# Altium schematic symbol library TTL74系列.SchLib: 649 symbols (part 2 of 6)
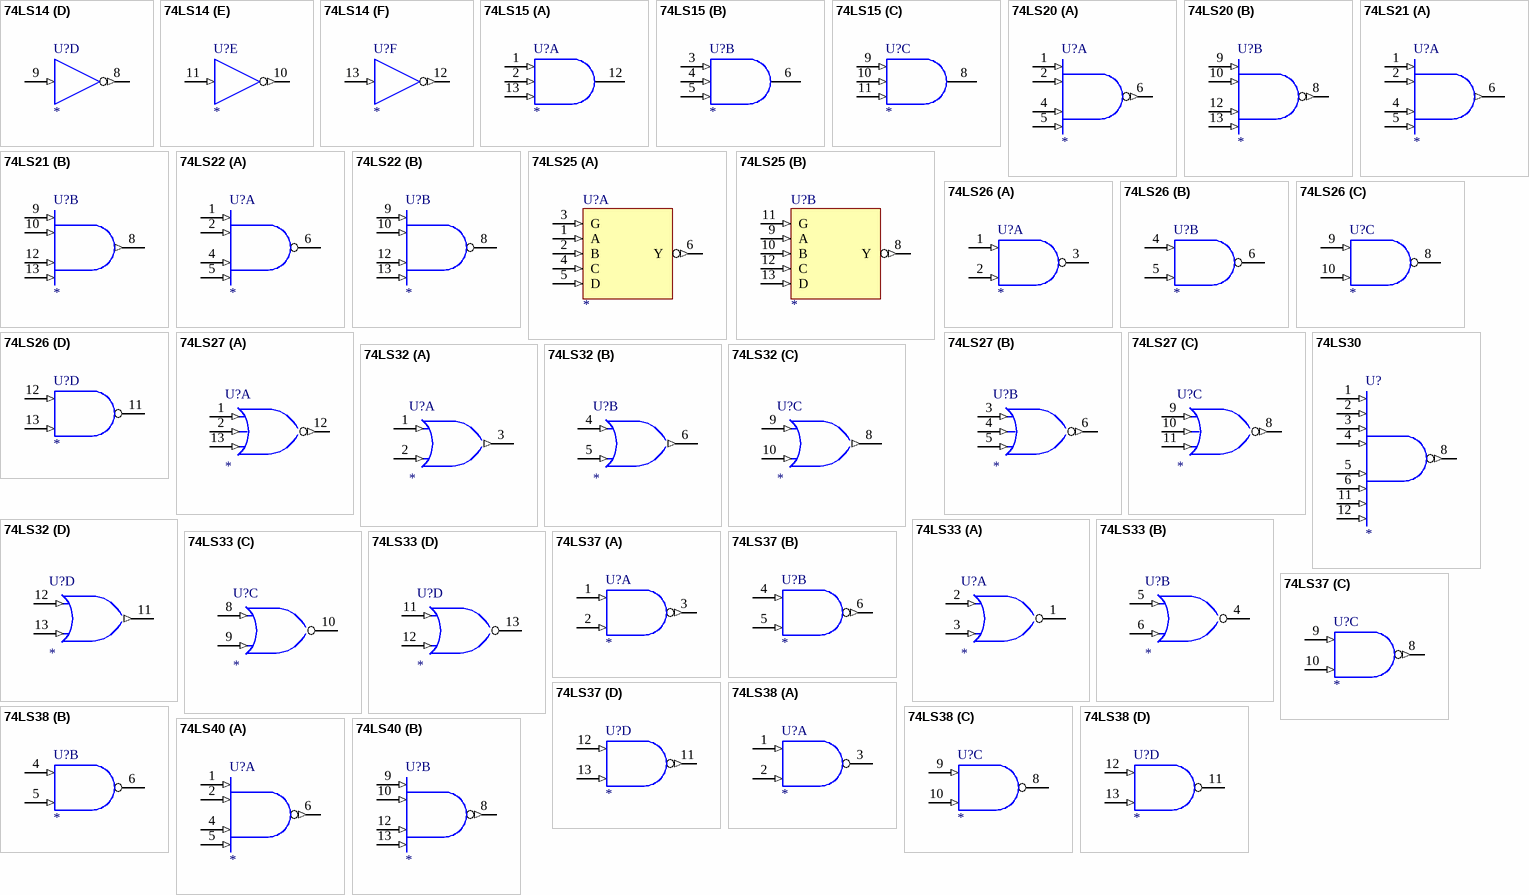
[diagram p31: symbols 74LS14 to 74LS40]

## 74LS26
designator U?
High-Voltage Interface Positive-NAND Gate
footprint DIP-14
simulation model 74LS26 (SIMCODE)
part A pins: 1 A (in), 2 B (in), 3 Y (oc), 7 GND (power) hidden to GND, 14 VCC (power) hidden to VCC
part B pins: 4 A (in), 5 B (in), 6 Y (oc), 7 GND (power) hidden to GND, 14 VCC (power) hidden to VCC
part C pins: 7 GND (power) hidden to GND, 8 Y (oc), 9 A (in), 10 B (in), 14 VCC (power) hidden to VCC
part D pins: 7 GND (power) hidden to GND, 11 Y (oc), 12 A (in), 13 B (in), 14 VCC (power) hidden to VCC
1 alternate drawing of the same symbol

## 74LS27
designator U?
Triple 3-Input Positive-NOR Gate
footprint DIP-14
simulation model 74LS27 (SIMCODE)
part A pins: 1 A (in), 2 B (in), 7 GND (power) hidden to GND, 12 Y (out), 13 C (in), 14 VCC (power) hidden to VCC
part B pins: 3 A (in), 4 B (in), 5 C (in), 6 Y (out), 7 GND (power) hidden to GND, 14 VCC (power) hidden to VCC
part C pins: 7 GND (power) hidden to GND, 8 Y (out), 9 A (in), 10 B (in), 11 C (in), 14 VCC (power) hidden to VCC
1 alternate drawing of the same symbol

## 74LS30
designator U?
8-Input Positive-NAND Gate
footprint DIP-14
simulation model 74LS30 (SIMCODE)
pins: 1 A (in), 2 B (in), 3 C (in), 4 D (in), 5 E (in), 6 F (in), 7 GND (power) hidden to GND, 8 Y (out), 11 G (in), 12 H (in), 14 VCC (power) hidden to VCC
1 alternate drawing of the same symbol

## 74LS32
designator U?
Quad 2-Input Positive-OR Gate
footprint DIP-14
simulation model 74LS32 (SIMCODE)
part A pins: 1 A (in), 2 B (in), 3 Y (out), 7 GND (power) hidden to GND, 14 VCC (power) hidden to VCC
part B pins: 4 A (in), 5 B (in), 6 Y (out), 7 GND (power) hidden to GND, 14 VCC (power) hidden to VCC
part C pins: 7 GND (power) hidden to GND, 8 Y (out), 9 A (in), 10 B (in), 14 VCC (power) hidden to VCC
part D pins: 7 GND (power) hidden to GND, 11 Y (out), 12 A (in), 13 B (in), 14 VCC (power) hidden to VCC
1 alternate drawing of the same symbol

## 74LS33
designator U?
Quad 2-Input Positive-NOR Buffer with Open-Collector Output
footprint DIP-14
simulation model 74LS33 (SIMCODE)
part A pins: 1 Y (oc), 2 A (in), 3 B (in), 7 GND (power) hidden to GND, 14 VCC (power) hidden to VCC
part B pins: 4 Y (oc), 5 A (in), 6 B (in), 7 GND (power) hidden to GND, 14 VCC (power) hidden to VCC
part C pins: 7 GND (power) hidden to GND, 8 A (in), 9 B (in), 10 Y (oc), 14 VCC (power) hidden to VCC
part D pins: 7 GND (power) hidden to GND, 11 A (in), 12 B (in), 13 Y (oc), 14 VCC (power) hidden to VCC
1 alternate drawing of the same symbol

## 74LS37
designator U?
Quad 2-Input Positive-NAND Buffer
footprint DIP-14
simulation model 74LS37 (SIMCODE)
part A pins: 1 A (in), 2 B (in), 3 Y (out), 7 GND (power) hidden to GND, 14 VCC (power) hidden to VCC
part B pins: 4 A (in), 5 B (in), 6 Y (out), 7 GND (power) hidden to GND, 14 VCC (power) hidden to VCC
part C pins: 7 GND (power) hidden to GND, 8 Y (out), 9 A (in), 10 B (in), 14 VCC (power) hidden to VCC
part D pins: 7 GND (power) hidden to GND, 11 Y (out), 12 A (in), 13 B (in), 14 VCC (power) hidden to VCC
1 alternate drawing of the same symbol

## 74LS38
designator U?
Quad 2-Input Positive-NAND Buffer with Open-Collector Output
footprint DIP-14
simulation model 74LS38 (SIMCODE)
part A pins: 1 A (in), 2 B (in), 3 Y (oc), 7 GND (power) hidden to GND, 14 VCC (power) hidden to VCC
part B pins: 4 A (in), 5 B (in), 6 Y (oc), 7 GND (power) hidden to GND, 14 VCC (power) hidden to VCC
part C pins: 7 GND (power) hidden to GND, 8 Y (oc), 9 A (in), 10 B (in), 14 VCC (power) hidden to VCC
part D pins: 7 GND (power) hidden to GND, 11 Y (oc), 12 A (in), 13 B (in), 14 VCC (power) hidden to VCC
1 alternate drawing of the same symbol

## 74LS40
designator U?
Dual 4-Input Positive-NAND Buffer
footprint DIP-14
simulation model 74LS40 (SIMCODE)
part A pins: 1 A (in), 2 B (in), 4 C (in), 5 D (in), 6 Y (out), 7 GND (power) hidden to GND, 14 VCC (power) hidden to VCC
part B pins: 7 GND (power) hidden to GND, 8 Y (out), 9 A (in), 10 B (in), 12 C (in), 13 D (in), 14 VCC (power) hidden to VCC
2 alternate drawings of the same symbol

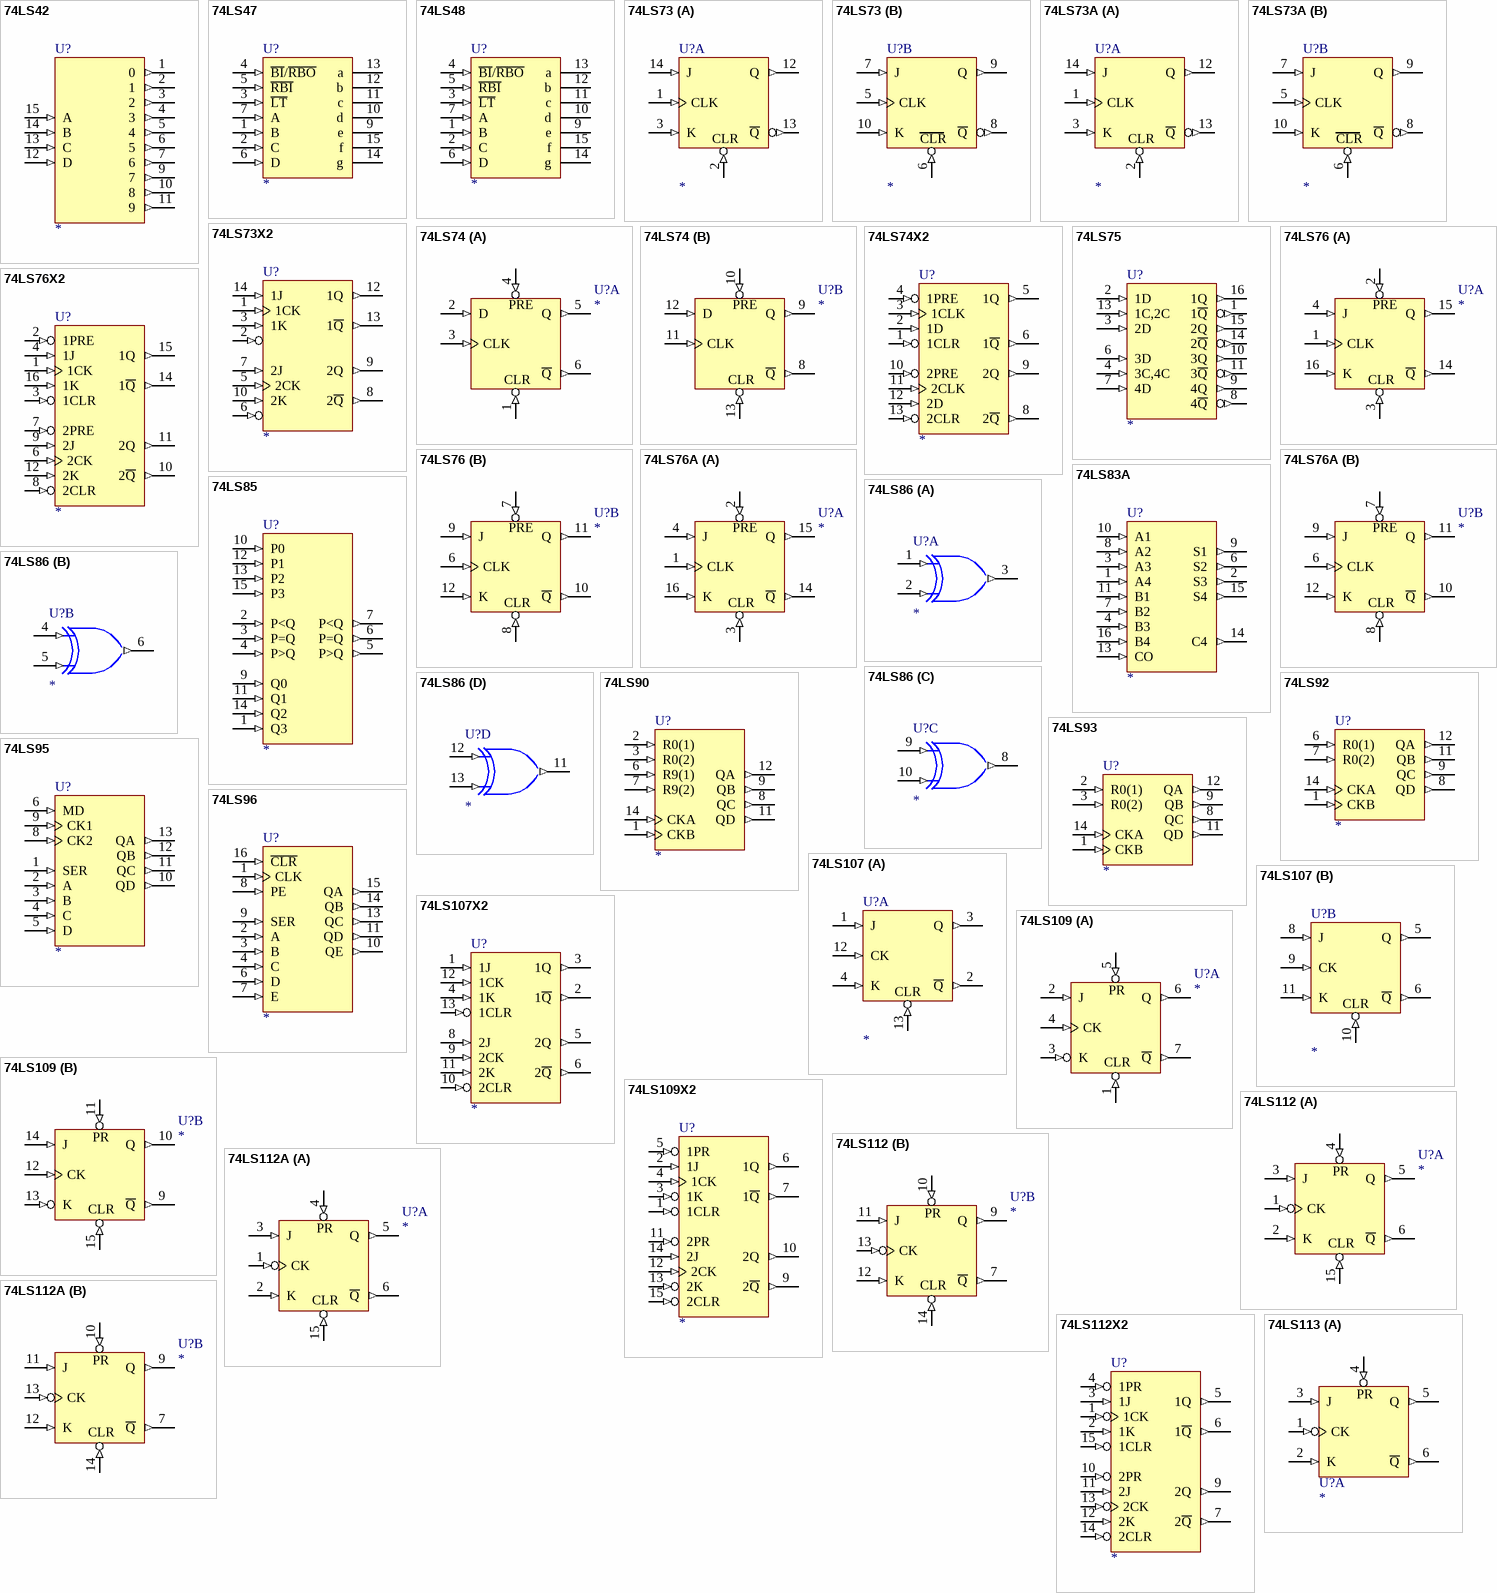
[diagram p6: symbols 74LS42 to 74LS113]

## 74LS42
designator U?
4-Line BCD to 10-Line Decimal Decoder
footprint DIP-16
simulation model 74LS42 (SIMCODE)
pins: 1 0 (out), 2 1 (out), 3 2 (out), 4 3 (out), 5 4 (out), 6 5 (out), 7 6 (out), 8 GND (power) hidden to GND, 9 7 (out), 10 8 (out), 11 9 (out), 12 D (in), 13 C (in), 14 B (in), 15 A (in), 16 VCC (power) hidden to VCC
1 alternate drawing of the same symbol

## 74LS47
designator U?
BCD-to-Seven-Segment Decoder/Driver
footprint DIP-16
simulation model 74LS47 (SIMCODE)
pins: 1 B (in), 2 C (in), 3 ~{LT} (in), 4 ~{BI}/~{RBO} (in), 5 ~{RBI} (in), 6 D (in), 7 A (in), 8 GND (power) hidden to GND, 9 e (oc), 10 d (oc), 11 c (oc), 12 b (oc), 13 a (oc), 14 g (oc), 15 f (oc), 16 VCC (power) hidden to VCC
1 alternate drawing of the same symbol

## 74LS48
designator U?
BCD-to-Seven-Segment Decoder/Driver
footprint DIP-16
simulation model 74LS48 (SIMCODE)
pins: 1 B (in), 2 C (in), 3 ~{LT} (in), 4 ~{BI}/~{RBO} (in), 5 ~{RBI} (in), 6 D (in), 7 A (in), 8 GND (power) hidden to GND, 9 e (oc), 10 d (oc), 11 c (oc), 12 b (oc), 13 a (oc), 14 g (oc), 15 f (oc), 16 VCC (power) hidden to VCC
1 alternate drawing of the same symbol

## 74LS73
designator U?
Dual J-K Flip-Flop with Clear
footprint DIP-14
simulation model 74LS73 (SIMCODE)
part A pins: 1 CLK (in), 2 ~{CLR} (in), 3 K (in), 4 VCC (power) hidden to VCC, 11 GND (power) hidden to GND, 12 Q (out), 13 ~{Q} (out), 14 J (in)
part B pins: 4 VCC (power) hidden to VCC, 5 CLK (in), 6 ~{CLR} (in), 7 J (in), 8 ~{Q} (out), 9 Q (out), 10 K (in), 11 GND (power) hidden to GND
1 alternate drawing of the same symbol
part A text: CLR
part B text: CLR

## 74LS73A
designator U?
Dual J-K Flip-Flop with Clear
footprint DIP-14
simulation model 74LS73A (SIMCODE)
part A pins: 1 CLK (in), 2 ~{CLR} (in), 3 K (in), 4 VCC (power) hidden to VCC, 11 GND (power) hidden to GND, 12 Q (out), 13 ~{Q} (out), 14 J (in)
part B pins: 4 VCC (power) hidden to VCC, 5 CLK (in), 6 ~{CLR} (in), 7 J (in), 8 ~{Q} (out), 9 Q (out), 10 K (in), 11 GND (power) hidden to GND
1 alternate drawing of the same symbol
part A text: CLR
part B text: CLR

## 74LS73X2
designator U?
Dual J-K Flip-Flop with Clear
footprint DIP-14
simulation model 74LS73X2 (SIMCODE)
pins: 1 1CK (in), 2 1CLR (in), 3 1K (in), 4 VCC (power) hidden to VCC, 5 2CK (in), 6 2CLR (in), 7 2J (in), 8 2~{Q} (out), 9 2Q (out), 10 2K (in), 11 GND (power) hidden to GND, 12 1Q (out), 13 1~{Q} (out), 14 1J (in)
1 alternate drawing of the same symbol

## 74LS74
designator U?
Dual D-Type Positive-Edge-Triggered Flip-Flop with Clear and Preset
footprint DIP-14
simulation model 74LS74 (SIMCODE)
part A pins: 1 ~{CLR} (in), 2 D (in), 3 CLK (in), 4 ~{PRE} (in), 5 Q (out), 6 ~{Q} (out), 7 GND (power) hidden to GND, 14 VCC (power) hidden to VCC
part B pins: 7 GND (power) hidden to GND, 8 ~{Q} (out), 9 Q (out), 10 ~{PRE} (in), 11 CLK (in), 12 D (in), 13 ~{CLR} (in), 14 VCC (power) hidden to VCC
1 alternate drawing of the same symbol
part A text: PRE; CLR
part B text: PRE; CLR

## 74LS74X2
designator U?
Dual D-Type Positive-Edge-Triggered Flip-Flop with Clear and Preset
footprint DIP-14
simulation model 74LS74X2 (SIMCODE)
pins: 1 1CLR (in), 2 1D (in), 3 1CLK (in), 4 1PRE (in), 5 1Q (out), 6 1~{Q} (out), 7 GND (power) hidden to GND, 8 2~{Q} (out), 9 2Q (out), 10 2PRE (in), 11 2CLK (in), 12 2D (in), 13 2CLR (in), 14 VCC (power) hidden to VCC
1 alternate drawing of the same symbol

## 74LS75
designator U?
4-Bit Bistable Latch
footprint DIP-16
simulation model 74LS75 (SIMCODE)
pins: 1 1~{Q} (out), 2 1D (in), 3 2D (in), 4 3C,4C (in), 5 VCC (power) hidden to VCC, 6 3D (in), 7 4D (in), 8 4~{Q} (out), 9 4Q (out), 10 3Q (out), 11 3~{Q} (out), 12 GND (power) hidden to GND, 13 1C,2C (in), 14 2~{Q} (out), 15 2Q (out), 16 1Q (out)
1 alternate drawing of the same symbol

## 74LS76
designator U?
Dual J-K Flip-Flop with Clear and Preset
footprint DIP-16
simulation model 74LS76 (SIMCODE)
part A pins: 1 CLK (in), 2 ~{PRE} (in), 3 ~{CLR} (in), 4 J (in), 5 VCC (power) hidden to VCC, 13 GND (power) hidden to GND, 14 ~{Q} (out), 15 Q (out), 16 K (in)
part B pins: 5 VCC (power) hidden to VCC, 6 CLK (in), 7 ~{PRE} (in), 8 ~{CLR} (in), 9 J (in), 10 ~{Q} (out), 11 Q (out), 12 K (in), 13 GND (power) hidden to GND
1 alternate drawing of the same symbol
part A text: PRE; CLR
part B text: PRE; CLR

## 74LS76A
designator U?
Dual J-K Flip-Flop with Clear and Preset
footprint DIP-16
simulation model 74LS76A (SIMCODE)
part A pins: 1 CLK (in), 2 ~{PRE} (in), 3 ~{CLR} (in), 4 J (in), 5 VCC (power) hidden to VCC, 13 GND (power) hidden to GND, 14 ~{Q} (out), 15 Q (out), 16 K (in)
part B pins: 5 VCC (power) hidden to VCC, 6 CLK (in), 7 ~{PRE} (in), 8 ~{CLR} (in), 9 J (in), 10 ~{Q} (out), 11 Q (out), 12 K (in), 13 GND (power) hidden to GND
1 alternate drawing of the same symbol
part A text: PRE; CLR
part B text: PRE; CLR

## 74LS76X2
designator U?
Dual J-K Flip-Flop with Clear and Preset
footprint DIP-16
simulation model 74LS76X2 (SIMCODE)
pins: 1 1CK (in), 2 1PRE (in), 3 1CLR (in), 4 1J (in), 5 VCC (power) hidden to VCC, 6 2CK (in), 7 2PRE (in), 8 2CLR (in), 9 2J (in), 10 2~{Q} (out), 11 2Q (out), 12 2K (in), 13 GND (power) hidden to GND, 14 1~{Q} (out), 15 1Q (out), 16 1K (in)
1 alternate drawing of the same symbol

## 74LS83A
designator U?
4-Bit Binary Full Adder with Fast Carry
footprint DIP-16
simulation model 74LS83A (SIMCODE)
pins: 1 A4 (in), 2 S3 (out), 3 A3 (in), 4 B3 (in), 5 VCC (power) hidden to VCC, 6 S2 (out), 7 B2 (in), 8 A2 (in), 9 S1 (out), 10 A1 (in), 11 B1 (in), 12 GND (power) hidden to GND, 13 CO (in), 14 C4 (out), 15 S4 (out), 16 B4 (in)
1 alternate drawing of the same symbol

## 74LS85
designator U?
4-Bit Magnitude Comparator
footprint DIP-16
simulation model 74LS85 (SIMCODE)
pins: 1 Q3 (in), 2 P<Q (in), 3 P=Q (in), 4 P>Q (in), 5 P>Q (out), 6 P=Q (out), 7 P<Q (out), 8 GND (power) hidden to GND, 9 Q0 (in), 10 P0 (in), 11 Q1 (in), 12 P1 (in), 13 P2 (in), 14 Q2 (in), 15 P3 (in), 16 VCC (power) hidden to VCC
1 alternate drawing of the same symbol

## 74LS86
designator U?
Quad Exclusive-OR Gate
footprint DIP-14
simulation model 74LS86 (SIMCODE)
part A pins: 1 A (in), 2 B (in), 3 Y (out), 7 GND (power) hidden to GND, 14 VCC (power) hidden to VCC
part B pins: 4 A (in), 5 B (in), 6 Y (out), 7 GND (power) hidden to GND, 14 VCC (power) hidden to VCC
part C pins: 7 GND (power) hidden to GND, 8 Y (out), 9 A (in), 10 B (in), 14 VCC (power) hidden to VCC
part D pins: 7 GND (power) hidden to GND, 11 Y (out), 12 A (in), 13 B (in), 14 VCC (power) hidden to VCC
1 alternate drawing of the same symbol

## 74LS90
designator U?
Binary Counter
footprint DIP-14
simulation model 74LS90 (SIMCODE)
pins: 1 CKB (in), 2 R0(1) (in), 3 R0(2) (in), 5 VCC (power) hidden to VCC, 6 R9(1) (in), 7 R9(2) (in), 8 QC (out), 9 QB (out), 10 GND (power) hidden to GND, 11 QD (out), 12 QA (out), 14 CKA (in)
1 alternate drawing of the same symbol

## 74LS92
designator U?
Divide-by-Twelve Counter
footprint DIP-14
simulation model 74LS92 (SIMCODE)
pins: 1 CKB (in), 5 VCC (power) hidden to VCC, 6 R0(1) (in), 7 R0(2) (in), 8 QD (out), 9 QC (out), 10 GND (power) hidden to GND, 11 QB (out), 12 QA (out), 14 CKA (in)
1 alternate drawing of the same symbol

## 74LS93
designator U?
4-Bit Binary Counter
footprint DIP-14
simulation model 74LS93 (SIMCODE)
pins: 1 CKB (in), 2 R0(1) (in), 3 R0(2) (in), 5 VCC (power) hidden to VCC, 8 QC (out), 9 QB (out), 10 GND (power) hidden to GND, 11 QD (out), 12 QA (out), 14 CKA (in)
1 alternate drawing of the same symbol

## 74LS95
designator U?
4-Bit Parallel-Access Shift Register
footprint DIP-14
simulation model 74LS95 (SIMCODE)
pins: 1 SER (in), 2 A (in), 3 B (in), 4 C (in), 5 D (in), 6 MD (in), 7 GND (power) hidden to GND, 8 CK2 (in), 9 CK1 (in), 10 QD (out), 11 QC (out), 12 QB (out), 13 QA (out), 14 VCC (power) hidden to VCC
1 alternate drawing of the same symbol

## 74LS96
designator U?
5-Bit Shift Register
footprint DIP-16
simulation model 74LS96 (SIMCODE)
pins: 1 CLK (in), 2 A (in), 3 B (in), 4 C (in), 5 VCC (power) hidden to VCC, 6 D (in), 7 E (in), 8 PE (in), 9 SER (in), 10 QE (out), 11 QD (out), 12 GND (power) hidden to GND, 13 QC (out), 14 QB (out), 15 QA (out), 16 ~{CLR} (in)
1 alternate drawing of the same symbol

## 74LS107
designator U?
Dual J-K Flip-Flops with Clear
footprint DIP-14
simulation model 74LS107 (SIMCODE)
part A pins: 1 J (in), 2 ~{Q} (out), 3 Q (out), 4 K (in), 7 GND (power) hidden to GND, 12 CK (in), 13 CLR (in), 14 VCC (power) hidden to VCC
part B pins: 5 Q (out), 6 ~{Q} (out), 7 GND (power) hidden to GND, 8 J (in), 9 CK (in), 10 CLR (in), 11 K (in), 14 VCC (power) hidden to VCC
1 alternate drawing of the same symbol

## 74LS107X2
designator U?
Dual J-K Flip-Flops with Clear
footprint DIP-14
simulation model 74LS107X2 (SIMCODE)
pins: 1 1J (in), 2 1~{Q} (out), 3 1Q (out), 4 1K (in), 5 2Q (out), 6 2~{Q} (out), 7 GND (power) hidden to GND, 8 2J (in), 9 2CK (in), 10 2CLR (in), 11 2K (in), 12 1CK (in), 13 1CLR (in), 14 VCC (power) hidden to VCC
1 alternate drawing of the same symbol

## 74LS109
designator U?
Dual J-~K Positive-Edge-Triggered Flip Flop with Preset and Clear
footprint DIP-16
simulation model 74LS109 (SIMCODE)
part A pins: 1 CLR (in), 2 J (in), 3 K (in), 4 CK (in), 5 PR (in), 6 Q (out), 7 ~{Q} (out), 8 GND (power) hidden to GND, 16 VCC (power) hidden to VCC
part B pins: 8 GND (power) hidden to GND, 9 ~{Q} (out), 10 Q (out), 11 PR (in), 12 CK (in), 13 K (in), 14 J (in), 15 CLR (in), 16 VCC (power) hidden to VCC
1 alternate drawing of the same symbol

## 74LS109X2
designator U?
Dual J-~K Positive-Edge-Triggered Flip Flop with Preset and Clear
footprint DIP-16
simulation model 74LS109X2 (SIMCODE)
pins: 1 1CLR (in), 2 1J (in), 3 1K (in), 4 1CK (in), 5 1PR (in), 6 1Q (out), 7 1~{Q} (out), 8 GND (power) hidden to GND, 9 2~{Q} (out), 10 2Q (out), 11 2PR (in), 12 2CK (in), 13 2K (in), 14 2J (in), 15 2CLR (in), 16 VCC (power) hidden to VCC
1 alternate drawing of the same symbol

## 74LS112
designator U?
Dual J-K Negative-Edge-Triggered Flip-Flop with Clear and Preset
footprint DIP-16
simulation model 74LS112 (SIMCODE)
part A pins: 1 CK (in), 2 K (in), 3 J (in), 4 PR (in), 5 Q (out), 6 ~{Q} (out), 8 GND (power) hidden to GND, 15 CLR (in), 16 VCC (power) hidden to VCC
part B pins: 7 ~{Q} (out), 8 GND (power) hidden to GND, 9 Q (out), 10 PR (in), 11 J (in), 12 K (in), 13 CK (in), 14 CLR (in), 16 VCC (power) hidden to VCC
1 alternate drawing of the same symbol

## 74LS112A
designator U?
Dual J-K Negative-Edge-Triggered Flip-Flop with Clear and Preset
footprint DIP-16
simulation model 74LS112A (SIMCODE)
part A pins: 1 CK (in), 2 K (in), 3 J (in), 4 PR (in), 5 Q (out), 6 ~{Q} (out), 8 GND (power) hidden to GND, 15 CLR (in), 16 VCC (power) hidden to VCC
part B pins: 7 ~{Q} (out), 8 GND (power) hidden to GND, 9 Q (out), 10 PR (in), 11 J (in), 12 K (in), 13 CK (in), 14 CLR (in), 16 VCC (power) hidden to VCC
1 alternate drawing of the same symbol

## 74LS112X2
designator U?
Dual J-K Negative-Edge-Triggered Flip-Flop with Clear and Preset
footprint DIP-16
simulation model 74LS112X2 (SIMCODE)
pins: 1 1CK (in), 2 1K (in), 3 1J (in), 4 1PR (in), 5 1Q (out), 6 1~{Q} (out), 7 2~{Q} (out), 8 GND (power) hidden to GND, 9 2Q (out), 10 2PR (in), 11 2J (in), 12 2K (in), 13 2CK (in), 14 2CLR (in), 15 1CLR (in), 16 VCC (power) hidden to VCC
1 alternate drawing of the same symbol

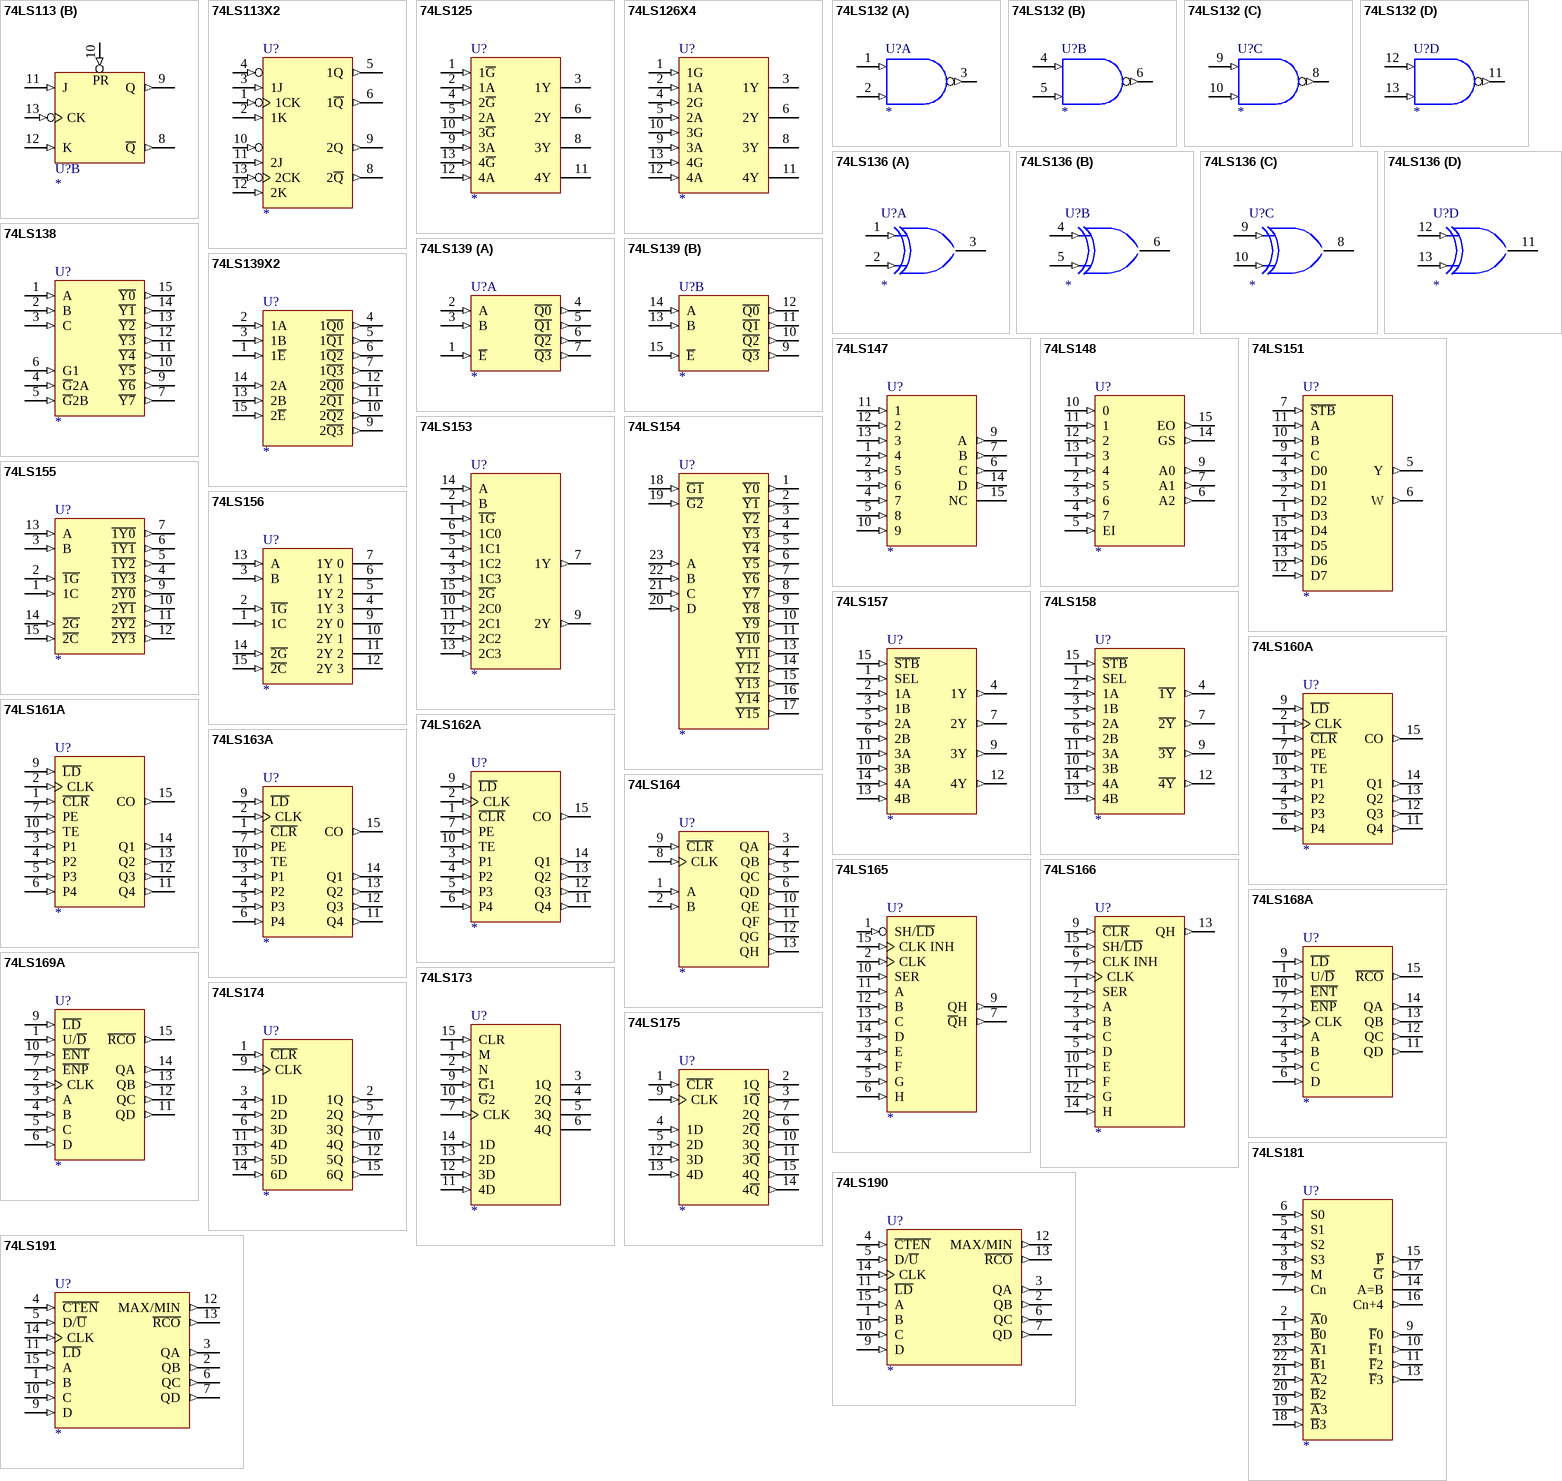
[diagram p7: symbols 74LS113 to 74LS191]

## 74LS113
designator U?
Dual J-K Negative-Edge-Triggered Flip-Flop with Preset
footprint DIP-14
simulation model 74LS113 (SIMCODE)
part A pins: 1 CK (in), 2 K (in), 3 J (in), 4 PR (in), 5 Q (out), 6 ~{Q} (out), 7 GND (power) hidden to GND, 14 VCC (power) hidden to VCC
part B pins: 7 GND (power) hidden to GND, 8 ~{Q} (out), 9 Q (out), 10 PR (in), 11 J (in), 12 K (in), 13 CK (in), 14 VCC (power) hidden to VCC
1 alternate drawing of the same symbol

## 74LS113X2
designator U?
Dual J-K Negative-Edge-Triggered Flip-Flop with Preset
footprint DIP-14
simulation model 74LS113X2 (SIMCODE)
pins: 1 1CK (in), 2 1K (in), 3 1J (in), 4 1PR (in), 5 1Q (out), 6 1~{Q} (out), 7 GND (power) hidden to GND, 8 2~{Q} (out), 9 2Q (out), 10 2PR (in), 11 2J (in), 12 2K (in), 13 2CK (in), 14 VCC (power) hidden to VCC
1 alternate drawing of the same symbol

## 74LS125
designator U?
Quad Bus Buffer Gate with 3-State Output
footprint DIP-14
simulation model 74LS125 (SIMCODE)
pins: 1 1~{G} (in), 2 1A (in), 3 1Y (hiz), 4 2~{G} (in), 5 2A (in), 6 2Y (hiz), 7 GND (power) hidden to GND, 8 3Y (hiz), 9 3A (in), 10 3~{G} (in), 11 4Y (hiz), 12 4A (in), 13 4~{G} (in), 14 VCC (power) hidden to VCC
1 alternate drawing of the same symbol

## 74LS126X4
designator U?
Quad Bus Buffer Gate with 3-State Output
footprint DIP-14
simulation model 74LS126X4 (SIMCODE)
pins: 1 1G (in), 2 1A (in), 3 1Y (hiz), 4 2G (in), 5 2A (in), 6 2Y (hiz), 7 GND (power) hidden to GND, 8 3Y (hiz), 9 3A (in), 10 3G (in), 11 4Y (hiz), 12 4A (in), 13 4G (in), 14 VCC (power) hidden to VCC
1 alternate drawing of the same symbol

## 74LS132
designator U?
Quad Positive-NAND Gate with Schmitt-Trigger Input
footprint DIP-14
simulation model 74LS132 (SIMCODE)
part A pins: 1 A (in), 2 B (in), 3 Y (out), 7 GND (power) hidden to GND, 14 VCC (power) hidden to VCC
part B pins: 4 A (in), 5 B (in), 6 Y (out), 7 GND (power) hidden to GND, 14 VCC (power) hidden to VCC
part C pins: 7 GND (power) hidden to GND, 8 Y (out), 9 A (in), 10 B (in), 14 VCC (power) hidden to VCC
part D pins: 7 GND (power) hidden to GND, 11 Y (out), 12 A (in), 13 B (in), 14 VCC (power) hidden to VCC
1 alternate drawing of the same symbol

## 74LS136
designator U?
Quad 2-Input Exclusive-OR Gate with Open-Collector Output
footprint DIP-14
simulation model 74LS136 (SIMCODE)
part A pins: 1 A (in), 2 B (in), 3 Y (oc), 7 GND (power) hidden to GND, 14 VCC (power) hidden to VCC
part B pins: 4 A (in), 5 B (in), 6 Y (oc), 7 GND (power) hidden to GND, 14 VCC (power) hidden to VCC
part C pins: 7 GND (power) hidden to GND, 8 Y (oc), 9 A (in), 10 B (in), 14 VCC (power) hidden to VCC
part D pins: 7 GND (power) hidden to GND, 11 Y (oc), 12 A (in), 13 B (in), 14 VCC (power) hidden to VCC
1 alternate drawing of the same symbol

## 74LS138
designator U?
3-Line to 8-Line Decoder/Demultiplexer
footprint DIP-16
simulation model 74LS138 (SIMCODE)
pins: 1 A (in), 2 B (in), 3 C (in), 4 ~{G}2A (in), 5 ~{G}2B (in), 6 G1 (in), 7 ~{Y7} (out), 8 GND (power) hidden to GND, 9 ~{Y6} (out), 10 ~{Y5} (out), 11 ~{Y4} (out), 12 ~{Y3} (out), 13 ~{Y2} (out), 14 ~{Y1} (out), 15 ~{Y0} (out), 16 VCC (power) hidden to VCC
1 alternate drawing of the same symbol

## 74LS139
designator U?
Dual 2-Line to 4-Line Decoder/Demultiplexer
footprint DIP-16
simulation model 74LS139 (SIMCODE)
part A pins: 1 ~{E} (in), 2 A (in), 3 B (in), 4 ~{Q0} (out), 5 ~{Q1} (out), 6 ~{Q2} (out), 7 ~{Q3} (out), 8 GND (power) hidden to GND, 16 VCC (power) hidden to VCC
part B pins: 8 GND (power) hidden to GND, 9 ~{Q3} (out), 10 ~{Q2} (out), 11 ~{Q1} (out), 12 ~{Q0} (out), 13 B (in), 14 A (in), 15 ~{E} (in), 16 VCC (power) hidden to VCC
1 alternate drawing of the same symbol

## 74LS139X2
designator U?
Dual 2-Line to 4-Line Decoder/Demultiplexer
footprint DIP-16
simulation model 74LS139X2 (SIMCODE)
pins: 1 1~{E} (in), 2 1A (in), 3 1B (in), 4 1~{Q0} (out), 5 1~{Q1} (out), 6 1~{Q2} (out), 7 1~{Q3} (out), 8 GND (power) hidden to GND, 9 2~{Q3} (out), 10 2~{Q2} (out), 11 2~{Q1} (out), 12 2~{Q0} (out), 13 2B (in), 14 2A (in), 15 2~{E} (in), 16 VCC (power) hidden to VCC
1 alternate drawing of the same symbol

## 74LS147
designator U?
10-Line to 4-Line Priority Encoder
footprint DIP-16
simulation model 74LS147 (SIMCODE)
pins: 1 4 (in), 2 5 (in), 3 6 (in), 4 7 (in), 5 8 (in), 6 C (out), 7 B (out), 8 GND (power) hidden to GND, 9 A (out), 10 9 (in), 11 1 (in), 12 2 (in), 13 3 (in), 14 D (out), 15 NC, 16 VCC (power) hidden to VCC
1 alternate drawing of the same symbol

## 74LS148
designator U?
8-Line to 3-Line Priority Encoder
footprint DIP-16
simulation model 74LS148 (SIMCODE)
pins: 1 4 (in), 2 5 (in), 3 6 (in), 4 7 (in), 5 EI (in), 6 A2 (out), 7 A1 (out), 8 GND (power) hidden to GND, 9 A0 (out), 10 0 (in), 11 1 (in), 12 2 (in), 13 3 (in), 14 GS (out), 15 EO (out), 16 VCC (power) hidden to VCC
1 alternate drawing of the same symbol

## 74LS151
designator U?
1 of 8 Data Selector/Multiplexer
footprint DIP-16
simulation model 74LS151 (SIMCODE)
pins: 1 D3 (in), 2 D2 (in), 3 D1 (in), 4 D0 (in), 5 Y (out), 6 W (out), 7 ~{STB} (in), 8 GND (power) hidden to GND, 9 C (in), 10 B (in), 11 A (in), 12 D7 (in), 13 D6 (in), 14 D5 (in), 15 D4 (in), 16 VCC (power) hidden to VCC
1 alternate drawing of the same symbol

## 74LS153
designator U?
Dual 4-Line to 1-Line Data Selector/Multiplexer
footprint DIP-16
simulation model 74LS153 (SIMCODE)
pins: 1 ~{1G} (in), 2 B (in), 3 1C3 (in), 4 1C2 (in), 5 1C1 (in), 6 1C0 (in), 7 1Y (out), 8 GND (power) hidden to GND, 9 2Y (out), 10 2C0 (in), 11 2C1 (in), 12 2C2 (in), 13 2C3 (in), 14 A (in), 15 ~{2G} (in), 16 VCC (power) hidden to VCC
1 alternate drawing of the same symbol

## 74LS154
designator U?
4-Line to 16-Line Decoder/Demultiplexer
footprint DIP-24
simulation model 74LS154 (SIMCODE)
pins: 1 ~{Y0} (out), 2 ~{Y1} (out), 3 ~{Y2} (out), 4 ~{Y3} (out), 5 ~{Y4} (out), 6 ~{Y5} (out), 7 ~{Y6} (out), 8 ~{Y7} (out), 9 ~{Y8} (out), 10 ~{Y9} (out), 11 ~{Y10} (out), 12 GND (power) hidden to GND, 13 ~{Y11} (out), 14 ~{Y12} (out), 15 ~{Y13} (out), 16 ~{Y14} (out), 17 ~{Y15} (out), 18 ~{G1} (in), 19 ~{G2} (in), 20 D (in), 21 C (in), 22 B (in), 23 A (in), 24 VCC (power) hidden to VCC
1 alternate drawing of the same symbol

## 74LS155
designator U?
Dual 2-Line to 4-Line Decoder/Demultiplexer
footprint DIP-16
simulation model 74LS155 (SIMCODE)
pins: 1 1C (in), 2 ~{1G} (in), 3 B (in), 4 ~{1Y3} (out), 5 ~{1Y2} (out), 6 ~{1Y1} (out), 7 ~{1Y0} (out), 8 GND (power) hidden to GND, 9 ~{2Y0} (out), 10 2~{Y1} (out), 11 ~{2Y2} (out), 12 ~{2Y3} (out), 13 A (in), 14 ~{2G} (in), 15 ~{2C} (in), 16 VCC (power) hidden to VCC
1 alternate drawing of the same symbol

## 74LS156
designator U?
Dual 2-Line to 4-Line Decoder/Demultiplexer with Open-Collector Outputs
footprint DIP-16
simulation model 74LS156 (SIMCODE)
pins: 1 1C (in), 2 ~{1G} (in), 3 B (in), 4 1Y 3 (oc), 5 1Y 2 (oc), 6 1Y 1 (oc), 7 1Y 0 (oc), 8 GND (power) hidden to GND, 9 2Y 0 (oc), 10 2Y 1 (oc), 11 2Y 2 (oc), 12 2Y 3 (oc), 13 A (in), 14 ~{2G} (in), 15 ~{2C} (in), 16 VCC (power) hidden to VCC
1 alternate drawing of the same symbol
